# Altium footprint library 9-Pcblib_Con.PcbLib: 266 footprints (part 3 of 17)
Each footprint in its own frame and in the unit in brackets; x right, y up, seen from the top. Pads: shape width x height; smd on the part's side, far side on the other; paste and mask are expansions set on the pad; w line width, h text height; cw(c..) or ccw(c..) is an arc to the next point about the centre after c.
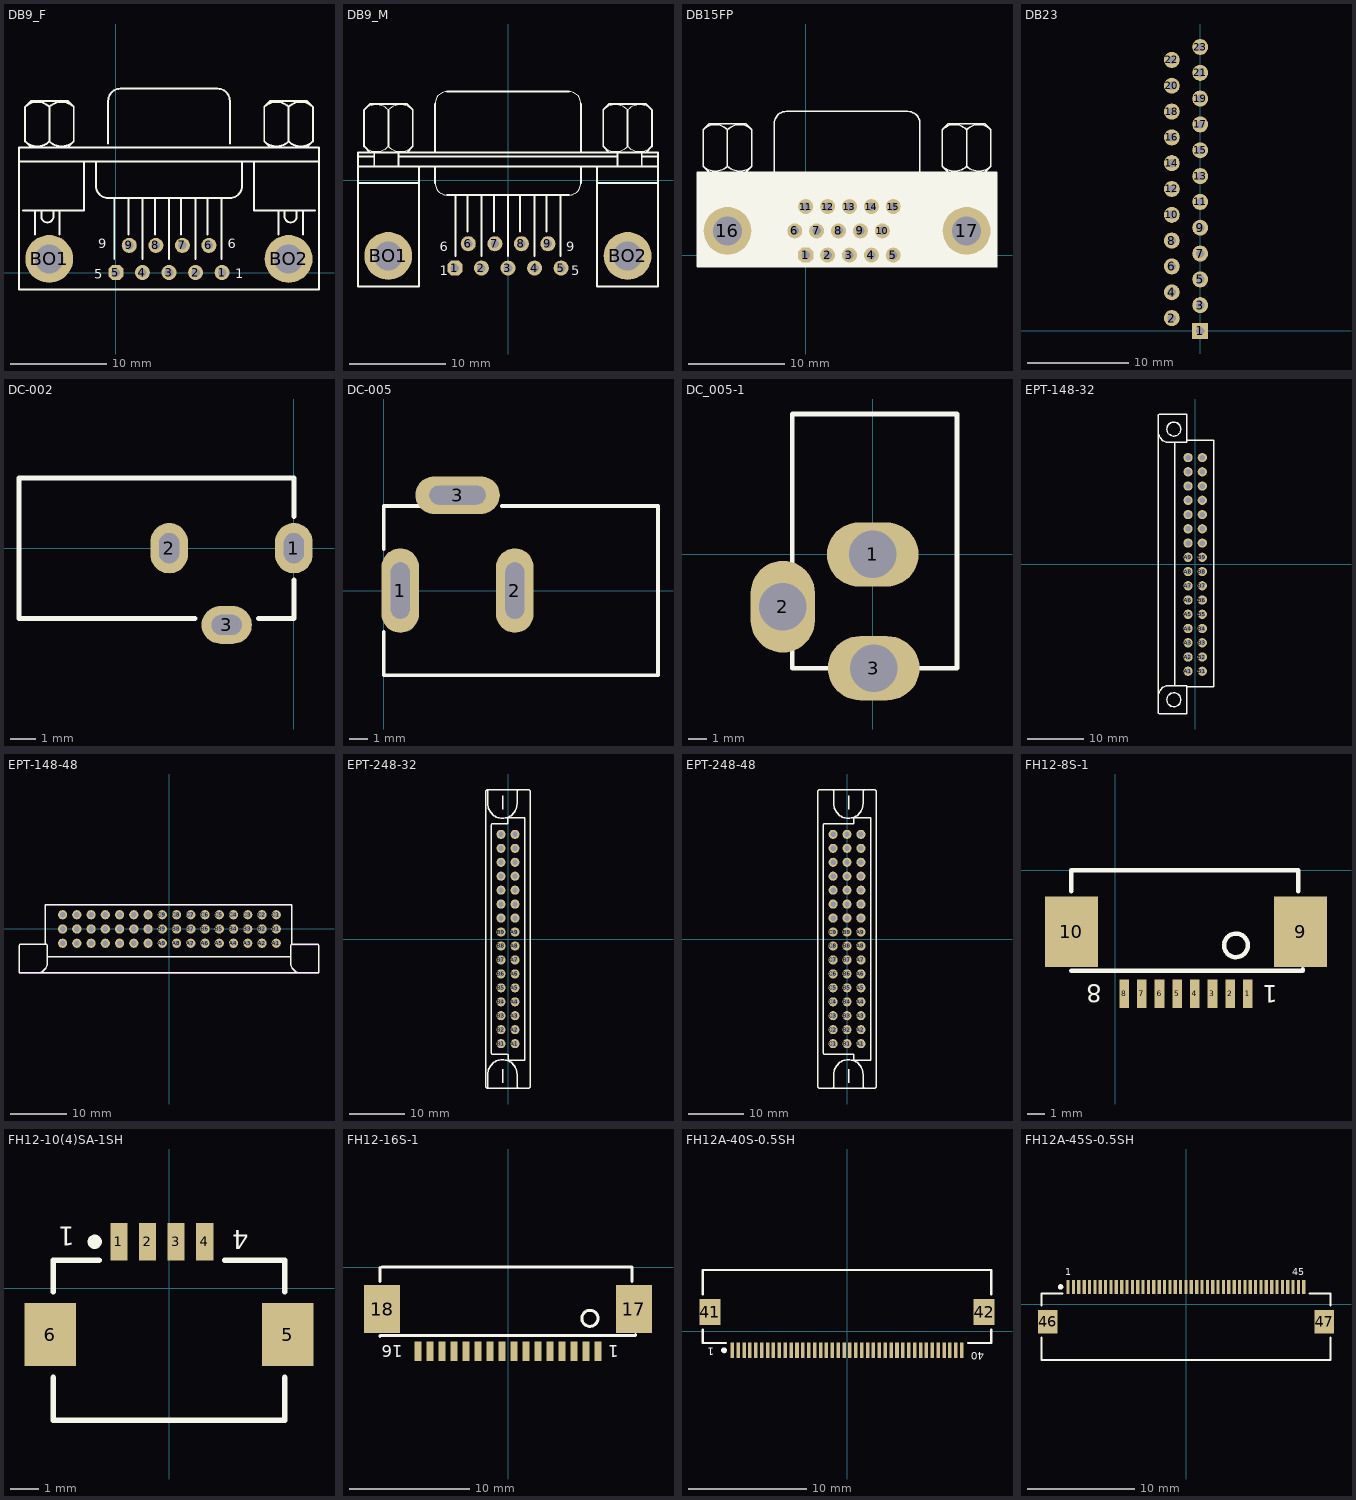
[diagram p2: the footprints below, top view; thin cyan lines are the x and y axes]

## DB9_F [mil]
height 62.99
pads (11):
  round 62 hole 35: 1(436.67,0) 2(327.5,0) 3(218.33,0) 4(109.17,0) 6(382.5,111.67) 7(273.33,111.67) 8(164.17,111.67) 9(55,111.67)
  oct 62x62 hole 35: 5(0,0)
  round 196.85 hole 118.11: BO1(-274.17,55.83) BO2(710,55.83)
Top Overlay:
  lines w8: -398.33,455.83 835,455.83 ; -381.67,255.83 -131.67,255.83 -131.67,455.83 ; -373.42,539.08 ccw(c-323.33,589.17) -273.25,539.08 ; -373.42,680.92 cw(c-323.33,630.83) -273.25,680.92 ; -348.33,514.17 -373.33,539.17 -373.33,680.83 -348.33,705.83 -198.33,705.83 -173.33,680.83 -173.33,539.17 -198.33,514.17 ; -331.67,155.83 -331.67,255.83 ; -306.67,255.83 -306.67,230.83 ccw(c-281.67,230.83) -256.67,230.83 -256.67,255.83 ; -273.42,539.08 ccw(c-223.33,589.17) -173.25,539.08 ; -273.42,680.92 cw(c-223.33,630.83) -173.25,680.92 ; -273.33,539.17 -273.33,680.83 ; -231.67,155.83 -231.67,255.83 ; -81.67,455.83 -81.67,355.83 ccw(c-31.67,355.83) -31.67,305.83 468.33,305.83 ccw(c468.33,355.83) 518.33,355.83 518.33,455.83 ; -31.67,530.83 -31.67,705.83 cw(c18.33,705.83) 18.33,755.83 393.33,755.83 418.33,755.83 cw(c418.33,705.83) 468.33,705.83 468.33,530.83 ; -6.67,55.83 -6.67,305.83 ; 51.67,155.83 51.67,305.83 ; 110,55.83 110,305.83 ; 160,155.83 160,305.83 ; 218.33,55.83 218.33,305.83 ; 268.33,155.83 268.33,305.83 ; 326.67,55.83 326.67,305.83 ; 376.67,155.83 376.67,305.83 ; 435,55.83 435,305.83 ; 568.33,455.83 568.33,255.83 818.33,255.83 ; 609.91,539.08 ccw(c660,589.17) 710.09,539.08 ; 609.91,680.92 cw(c660,630.83) 710.09,680.92 ; 635,514.17 610,539.17 610,680.83 635,705.83 785,705.83 810,680.83 810,539.17 785,514.17 ; 668.33,155.83 668.33,255.83 ; 693.33,255.83 693.33,230.83 ccw(c718.33,230.83) 743.33,230.83 743.33,255.83 ; 709.91,539.08 ccw(c760,589.17) 810.09,539.08 ; 709.91,680.92 cw(c760,630.83) 810.09,680.92 ; 710,539.17 710,680.83 ; 768.33,155.83 768.33,255.83 ; -398.33,-69.17 -398.33,514.17 835,514.17 835,-69.17 -398.33,-69.17
  text "6" at 459,99 h39.37
  text "1" at 491,-24 h39.37
  text "5" at -90,-25 h39.37
  text "9" at -72,100 h39.37
Mechanical 1:
  lines w59.06: -315,55 -314.17,55.83 ; 665,55 665.83,55.83 710,55.83
3D body: height 501.97, standoff -143.7, extent -382.39,-67.63 818.4,629.22

## DB9_M [mil]
height 200
pads (11):
  oct 62x62 hole 35: 1(-219.92,-360)
  round 62 hole 35: 2(-110.75,-360) 3(-1.59,-360) 4(107.58,-360) 5(216.74,-360) 6(-164.92,-260) 7(-55.75,-260) 8(53.41,-260) 9(162.58,-260)
  round 196.67 hole 118.33: BO1(-494.09,-310) BO2(490.08,-310)
Top Overlay:
  lines w3: -593.34,139.91 ccw(c-543.25,190) -493.17,139.91 ; -593.34,290.09 cw(c-543.25,240) -493.17,290.09 ; -493.34,139.91 ccw(c-443.25,190) -393.17,139.91 ; -493.34,290.09 cw(c-443.25,240) -393.17,290.09 ; -301.59,-10 ccw(c-251.59,-10) -251.59,-60 ; -301.59,315 cw(c-251.59,315) -251.59,365 ; 248.41,-60 ccw(c248.41,-10) 298.41,-10 ; 248.41,365 cw(c248.41,315) 298.41,315 ; 389.99,139.91 ccw(c440.08,190) 490.16,139.91 ; 389.99,290.09 cw(c440.08,240) 490.16,290.09 ; 489.99,139.91 ccw(c540.08,190) 590.16,139.91 ; 489.99,290.09 cw(c540.08,240) 590.16,290.09
  lines w7.87: -618.25,-10 -368.25,-10 ; -618.25,56.67 615.08,56.67 ; -618.25,98.33 -551.59,98.33 ; -568.25,115 -593.25,140 -593.25,290 -568.25,315 -418.25,315 -393.25,290 -393.25,140 -418.25,115 ; -551.59,56.67 -551.59,115 ; -493.25,140 -493.25,290 ; -451.59,56.67 -451.59,115 ; -451.59,98.33 448.41,98.33 ; -368.25,56.67 -368.25,-435 -618.25,-435 -618.25,115 615.08,115 615.08,-435 365.08,-435 365.08,56.67 ; -301.59,-10 -301.59,56.67 ; -301.59,115 -301.59,315 ; -251.59,-60 248.41,-60 ; -251.59,365 248.41,365 ; -218.25,-310 -218.25,-60 ; -168.25,-210 -168.25,-60 ; -109.92,-310 -109.92,-60 ; -59.92,-210 -59.92,-60 ; -1.59,-310 -1.59,-60 ; 48.41,-210 48.41,-60 ; 106.74,-310 106.74,-60 ; 156.74,-210 156.74,-60 ; 215.08,-310 215.08,-60 ; 298.41,-10 298.41,56.67 ; 298.41,115 298.41,315 ; 365.08,-10 615.08,-10 ; 415.08,115 390.08,140 390.08,290 415.08,315 565.08,315 590.08,290 590.08,140 565.08,115 ; 448.41,56.67 448.41,115 ; 490.08,140 490.08,290 ; 548.41,56.67 548.41,115 ; 548.41,98.33 615.08,98.33
  text "6" at -281.59,-290 h39.37
  text "1" at -281.59,-390 h39.37
  text "5" at 258.41,-390 h39.37
  text "9" at 238.41,-290 h39.37
3D body: height 504.38, standoff -114.62, extent -614.5,-450 598.5,301

## DB15FP [mil]
pads (17):
  oct 62x62 hole 35: 1(0,0)
  round 62 hole 35: 2(90,0) 3(180,0) 4(270,0) 5(360,0) 6(-45,100) 7(45,100) 8(135,100) 9(225,100) 10(315,100) 11(0,200) 12(90,200) 13(180,200) 14(270,200) 15(360,200)
  round 196.67 hole 118.33: 16(-321.67,100) 17(661.67,100)
Top Overlay:
  rectangle: -445.08,-44.84 781.92,338.16
  lines w6: -447.08,340.16 -446.67,-46.84 786.67,-46.84 786.67,341.16 -446.67,341.16 ; -446.67,307.83 786.67,307.83 ; -421.75,366.07 ccw(c-371.67,416.16) -321.58,366.07 ; -421.75,516.25 cw(c-371.67,466.16) -321.58,516.25 ; -396.67,341.16 -421.67,366.16 -421.67,516.16 -396.67,541.16 -246.67,541.16 -221.67,516.16 -221.67,366.16 -246.67,341.16 ; -321.75,366.07 ccw(c-271.67,416.16) -221.58,366.07 ; -321.75,516.25 cw(c-271.67,466.16) -221.58,516.25 ; -321.67,366.16 -321.67,516.16 ; -230.41,280.16 -447.08,280.16 785.67,280.16 ; -230.08,-46.84 -230,40 ; -230.08,276.16 -230,160 ; -130,341.16 -130,541.16 cw(c-80,541.16) -80,591.16 420,591.16 cw(c420,541.16) 470,541.16 470,341.16 ; 561.58,366.07 ccw(c611.67,416.16) 661.75,366.07 ; 561.58,516.25 cw(c611.67,466.16) 661.75,516.25 ; 569.92,-46.84 570,38 ; 569.92,281.16 570,164 ; 586.67,341.16 561.67,366.16 561.67,516.16 586.67,541.16 736.67,541.16 761.67,516.16 761.67,366.16 736.67,341.16 ; 661.58,366.07 ccw(c711.67,416.16) 761.75,366.07 ; 661.58,516.25 cw(c711.67,466.16) 761.75,516.25 ; 661.67,366.16 661.67,516.16
  text "1" at -70,-20 h50
  text "6" at -130,80 h50
  text "11" at -110,180 h50
  text "15" at 430,180 h50
  text "10" at 370,80 h50
  text "5" at 430,-20 h50

## DB23 [mil]
pads (23):
  rect 62x62 hole 32: 1(0,0)
  round 62 hole 32: 2(-110,50) 3(0,100) 4(-110,150) 5(0,200) 6(-110,250) 7(0,300) 8(-110,350) 9(0,400) 10(-110,450) 11(0,500) 12(-110,550) 13(0,600) 14(-110,650) 15(0,700) 16(-110,750) 17(0,800) 18(-110,850) 19(0,900) 20(-110,950) 21(0,1000) 22(-110,1050) 23(0,1100)

## DC-002 [mm] "DC母座3.5mm"
height 7.2
pads (3):
  oval 1.5x2 hole 0.8 slot 1.2 at 90 deg: 1(0,0) 2(-4.953,0)
  oval 2x1.5 hole 0.8 slot 1.2 at 0 deg: 3(-2.667,-3.048)
Top Overlay:
  lines w0.2: -3.937,-2.794 -10.922,-2.794 -10.922,2.794 0,2.794 0,1.27 ; -1.397,-2.794 0,-2.794 0,-1.27
3D body: height 7.2, standoff 0, extent -10.922,-2.794 0,2.794

## DC-005 [mm] "DC母座5.5mm"
height 12.75
pads (3):
  oval 2x4.5 hole 1 slot 3 at 90 deg: 1(0.889,0) 2(6.985,0)
  oval 4.5x2 hole 1 slot 3 at 0 deg: 3(3.937,5.08)
Top Overlay:
  lines w0.2: 0.005,-2.2 0.005,-4.5 14.605,-4.5 14.605,4.5 6.305,4.5 ; 0.005,2.2 0.005,4.5 1.905,4.5
3D body: height 11, standoff 0, extent 0,-4.445 14.605,4.445

## DC_005-1 [mil]
pads (3):
  oval 197x138 hole 102: 1(0,0) 3(2,-244)
  oval 138x197 hole 102: 2(-193,-112)
Top Overlay:
  lines w10: -173,-244 -173,301.66 181,301.66 181,-244 -171,-244

## EPT-148-32 [mil]
pads (32):
  round 65 hole 39: A1(-50,-750) A2(-50,-650) A3(-50,-550) A4(-50,-450) A5(-50,-350) A6(-50,-250) A7(-50,-150) A8(-50,-50) A9(-50,50) A10(-50,150) A11(-50,250) A12(-50,350) A13(-50,450) A14(-50,550) A15(-50,650) A16(-50,750) B1(50,-750) B2(50,-650) B3(50,-550) B4(50,-450) B5(50,-350) B6(50,-250) B7(50,-150) B8(50,-50) B9(50,50) B10(50,150) B11(50,250) B12(50,350) B13(50,450) B14(50,550) B15(50,650) B16(50,750)
Top Overlay:
  circle w10: c-150,950 r49
  circle w10: c-150,-950 r49
  lines w10: -145,-850 -145,824.8 -145,856 ; -58.66,870 129.72,870 129.72,-859 -58.28,-859 ; -258.66,-925 cw(c-183.66,-925) -183.66,-850 -153.66,-850 -62.66,-850 -58.66,-855 -58.66,-1045 -63.66,-1050 -253.66,-1050 -258.66,-1045 -258.66,-925 ; -258.66,-925 -258.66,931 ; -258.66,931 ccw(c-183.66,931) -183.66,856 -153.66,856 -63.66,856 -58.66,861 -58.66,1051 -63.66,1056 -253.66,1056 -258.66,1051 -258.66,931
3D body: height 273.62, standoff -114.17, extent -547.74,-1048.79 59.74,1052

## EPT-148-48 [mil]
height 551.18
pads (48):
  round 65 hole 39: A1(750,-100) A2(650,-100) A3(550,-100) A4(450,-100) A5(350,-100) A6(250,-100) A7(150,-100) A8(50,-100) A9(-50,-100) A10(-150,-100) A11(-250,-100) A12(-350,-100) A13(-450,-100) A14(-550,-100) A15(-650,-100) A16(-750,-100) B1(750,0) B2(650,0) B3(550,0) B4(450,0) B5(350,0) B6(250,0) B7(150,0) B8(50,0) B9(-50,0) B10(-150,0) B11(-250,0) B12(-350,0) B13(-450,0) B14(-550,0) B15(-650,0) B16(-750,0) C1(750,100) C2(650,100) C3(550,100) C4(450,100) C5(350,100) C6(250,100) C7(150,100) C8(50,100) C9(-50,100) C10(-150,100) C11(-250,100) C12(-350,100) C13(-450,100) C14(-550,100) C15(-650,100) C16(-750,100)
Top Overlay:
  lines w10: -870,-108.66 -870,169 859,169 859,-108.28 ; -856,-195 -824.8,-195 850,-195 ; -931,-308.66 ccw(c-931,-233.66) -856,-233.66 -856,-203.66 -856,-113.66 -861,-108.66 -1051,-108.66 -1056,-113.66 -1056,-303.66 -1051,-308.66 -931,-308.66 ; -931,-308.66 925,-308.66 ; 925,-308.66 cw(c925,-233.66) 850,-233.66 850,-203.66 850,-112.66 855,-108.66 1045,-108.66 1050,-113.66 1050,-303.66 1045,-308.66 925,-308.66
Mechanical 13:
  lines w3.94: -1054.95,-310.28 1050.05,-310.28 1050.05,-110.28 860.05,-110.28 860.05,169.72 -869.95,169.72 -869.95,54.72 -869.95,-110.28
3D body: height 374.02, standoff -101.38, extent -1061.02,-598.64 1061.03,110.89

## EPT-248-32 [mil]
height 80
pads (32):
  round 65 hole 39: A1(50,-750) A2(50,-650) A3(50,-550) A4(50,-450) A5(50,-350) A6(50,-250) A7(50,-150) A8(50,-50) A9(50,50) A10(50,150) A11(50,250) A12(50,350) A13(50,450) A14(50,550) A15(50,650) A16(50,750) B1(-50,-750) B2(-50,-650) B3(-50,-550) B4(-50,-450) B5(-50,-350) B6(-50,-250) B7(-50,-150) B8(-50,-50) B9(-50,50) B10(-50,150) B11(-50,250) B12(-50,350) B13(-50,450) B14(-50,550) B15(-50,650) B16(-50,750)
Top Overlay:
  lines w10: -38.19,-1030.81 -38.19,-932.81 ; -38.19,930 -38.19,1028 ; 80,-1070 cw(c80,-1055) 65,-1055 65,-970 ccw(c-40,-970) -145,-970 -145,-1070 ; 80,1070.08 ccw(c80,1055.08) 65,1055.08 65,970.08 cw(c-40,970.08) -145,970.08 -145,1070 ; -145,-1070 cw(c-145,-1055) -160,-1055 -160,1055 cw(c-145,1055) -145,1070 ; -145,-1070 145,-1070 ccw(c145,-1055) 160,-1055 160,1055 ccw(c145,1055) 145,1070 -145,1070 ; -120,-820 -115,-825 -5,-825 0,-830 0,-865 ccw(c5,-865) 5,-870 115,-870 120,-865 120,865 115,870 5,870 ccw(c5,865) 0,865 0,830 -5,825 -115,825 -120,820 -120,-820
3D body: height 452.76, standoff -153.54, extent -157.9,-1072.08 161,1068.08

## EPT-248-48 [mil]
height 393.7
pads (48):
  round 65 hole 39: A1(100,-750) A2(100,-650) A3(100,-550) A4(100,-450) A5(100,-350) A6(100,-250) A7(100,-150) A8(100,-50) A9(100,50) A10(100,150) A11(100,250) A12(100,350) A13(100,450) A14(100,550) A15(100,650) A16(100,750) B1(0,-750) B2(0,-650) B3(0,-550) B4(0,-450) B5(0,-350) B6(0,-250) B7(0,-150) B8(0,-50) B9(0,50) B10(0,150) B11(0,250) B12(0,350) B13(0,450) B14(0,550) B15(0,650) B16(0,750) C1(-100,-750) C2(-100,-650) C3(-100,-550) C4(-100,-450) C5(-100,-350) C6(-100,-250) C7(-100,-150) C8(-100,-50) C9(-100,50) C10(-100,150) C11(-100,250) C12(-100,350) C13(-100,450) C14(-100,550) C15(-100,650) C16(-100,750)
Top Overlay:
  lines w10: -110,-1070 ccw(c-110,-1055) -95,-1055 -95,-970 cw(c10,-970) 115,-970 115,-1055 ccw(c130,-1055) 130,-1070 ; -110,1070.08 cw(c-110,1055.08) -95,1055.08 -95,970.08 ccw(c10,970.08) 115,970.08 115,1055.08 cw(c130,1055.08) 130,1070.08 ; 11.81,-1030.81 11.81,-932.81 ; 11.81,930 11.81,1028 ; -210,-1055 ccw(c-195,-1055) -195,-1070 195,-1070 ccw(c195,-1055) 210,-1055 210,1055 ccw(c195,1055) 195,1070 -195,1070 ccw(c-195,1055) -210,1055 -210,-1055 ; -170,-820 -170,820 -165,825 45,825 50,830 50,865 cw(c55,865) 55,870 165,870 170,865 170,-865 165,-870 55,-870 cw(c55,-865) 50,-865 50,-830 45,-825 -165,-825 -170,-820
3D body: height 476.38, standoff -170.08, extent -207.32,-1081.35 210,1084

## FH12-8S-1 [mm]
height 3.5
pads (10):
  rect 0.55x1.6 smd: 1(7.5,-7) 2(6.5,-7) 3(5.5,-7) 4(4.5,-7) 5(3.5,-7) 6(2.5,-7) 7(1.5,-7) 8(0.5,-7)
  rect 3x4 smd: 9(10.5,-3.5) 10(-2.5,-3.5)
Top Overlay:
  circle w0.254: c6.829,-4.26 r0.671
  lines w0.254: -2.5,-5.7 10.54,-5.7 ; -2.5,-1.2 -2.5,-0.01 ; -2.5,0 10.35,0 10.35,-1.2 ; 10.62,-5.7 10.625,-5.625
  text "1" at 9.21,-6.52 h1
  text "8" at -0.787,-6.502 h1

## FH12-10(4)SA-1SH [mm] "Connector; FH12 Series; 4 Position; 1.0mm Spaced Bottom Eccentric Contact"
height 2
pads (6):
  rect 0.6x1.3 smd: 1(-1.75,1.625) 2(-0.75,1.625) 3(0.25,1.625) 4(1.25,1.625)
  rect 1.8x2.2 smd: 5(4.15,-1.625) 6(-4.15,-1.625)
Top Overlay:
  circle w0.25: c-2.6,1.625 r0.125
  lines w0.2: -4.05,-3.125 -4.05,-4.625 4.05,-4.625 4.05,-3.125 ; -4.05,-0.125 -4.05,0.975 -2.45,0.975 ; 1.95,0.975 4.05,0.975 4.05,-0.125
  text "1" at -3.302,2.159 h0.66
  text "4" at 2.794,2.032 h0.66

## FH12-16S-1 [mm]
height 3.5
pads (18):
  rect 0.55x1.6 smd: 1(7.5,-7) 2(6.5,-7) 3(5.5,-7) 4(4.5,-7) 5(3.5,-7) 6(2.5,-7) 7(1.5,-7) 8(0.5,-7) 9(-0.5,-7) 10(-1.5,-7) 11(-2.5,-7) 12(-3.5,-7) 13(-4.5,-7) 14(-5.5,-7) 15(-6.5,-7) 16(-7.5,-7)
  rect 3x4 smd: 17(10.5,-3.5) 18(-10.5,-3.5)
Top Overlay:
  circle w0.254: c6.829,-4.26 r0.671
  lines w0.254: -10.66,-5.775 -10.66,-5.7 -0.5,-5.7 10.54,-5.7 ; -10.66,-1.2 -10.66,-0.01 ; -10.5,0 10.35,0 10.35,-1.2 ; 10.62,-5.7 10.625,-5.625
  text "16" at -8.75,-6.5 h1
  text "1" at 9.21,-6.52 h1

## FH12A-40S-0.5SH [mm] "Connector; FH12 Series; 40 Position; 0.5mm Spaced Top Contact"
height 2
pads (42):
  rect 0.3x1.3 smd: 1(-9.75,-1.625) 2(-9.25,-1.625) 3(-8.75,-1.625) 4(-8.25,-1.625) 5(-7.75,-1.625) 6(-7.25,-1.625) 7(-6.75,-1.625) 8(-6.25,-1.625) 9(-5.75,-1.625) 10(-5.25,-1.625) 11(-4.75,-1.625) 12(-4.25,-1.625) 13(-3.75,-1.625) 14(-3.25,-1.625) 15(-2.75,-1.625) 16(-2.25,-1.625) 17(-1.75,-1.625) 18(-1.25,-1.625) 19(-0.75,-1.625) 20(-0.25,-1.625) 21(0.25,-1.625) 22(0.75,-1.625) 23(1.25,-1.625) 24(1.75,-1.625) 25(2.25,-1.625) 26(2.75,-1.625) 27(3.25,-1.625) 28(3.75,-1.625) 29(4.25,-1.625) 30(4.75,-1.625) 31(5.25,-1.625) 32(5.75,-1.625) 33(6.25,-1.625) 34(6.75,-1.625) 35(7.25,-1.625) 36(7.75,-1.625) 37(8.25,-1.625) 38(8.75,-1.625) 39(9.25,-1.625) 40(9.75,-1.625)
  rect 1.8x2.2 smd: 41(-11.65,1.625) 42(11.65,1.625)
Top Overlay:
  circle w0.25: c-10.45,-1.625 r0.125
  lines w0.2: -12.25,0.125 -12.25,-1 -10.3,-1 ; -12.25,3.125 -12.25,5.2 12.25,5.2 12.25,3.125 ; 10.3,-1 12.25,-1 12.25,0.125
  text "40" at 11.684,-1.778 h0.66
  text "1" at -11.303,-1.397 h0.66

## FH12A-45S-0.5SH [mm] "Connector; FH12 Series; 45 Position; 0.5mm Spaced Top Contact"
height 2
pads (47):
  rect 0.3x1.3 smd: 1(-11,1.625) 2(-10.5,1.625) 3(-10,1.625) 4(-9.5,1.625) 5(-9,1.625) 6(-8.5,1.625) 7(-8,1.625) 8(-7.5,1.625) 9(-7,1.625) 10(-6.5,1.625) 11(-6,1.625) 12(-5.5,1.625) 13(-5,1.625) 14(-4.5,1.625) 15(-4,1.625) 16(-3.5,1.625) 17(-3,1.625) 18(-2.5,1.625) 19(-2,1.625) 20(-1.5,1.625) 21(-1,1.625) 22(-0.5,1.625) 23(0,1.625) 24(0.5,1.625) 25(1,1.625) 26(1.5,1.625) 27(2,1.625) 28(2.5,1.625) 29(3,1.625) 30(3.5,1.625) 31(4,1.625) 32(4.5,1.625) 33(5,1.625) 34(5.5,1.625) 35(6,1.625) 36(6.5,1.625) 37(7,1.625) 38(7.5,1.625) 39(8,1.625) 40(8.5,1.625) 41(9,1.625) 42(9.5,1.625) 43(10,1.625) 44(10.5,1.625) 45(11,1.625)
  rect 1.8x2.2 smd: 46(-12.9,-1.625) 47(12.9,-1.625)
Top Overlay:
  circle w0.25: c-11.7,1.625 r0.125
  lines w0.2: -13.5,-3.125 -13.5,-5.2 13.5,-5.2 13.5,-3.125 ; -13.5,-0.125 -13.5,1 -11.55,1 ; 11.55,1 13.5,1 13.5,-0.125
  text "1" at -11.25,2.725 h0.66
  text "45" at 9.9,2.725 h0.66